# Altium footprint library Inductors SMD.PcbLib: 145 footprints (part 7 of 10)
Each footprint in its own frame and in the unit in brackets; x right, y up, seen from the top. Pads: shape width x height; smd on the part's side, far side on the other; paste and mask are expansions set on the pad; w line width, h text height; cw(c..) or ccw(c..) is an arc to the next point about the centre after c.
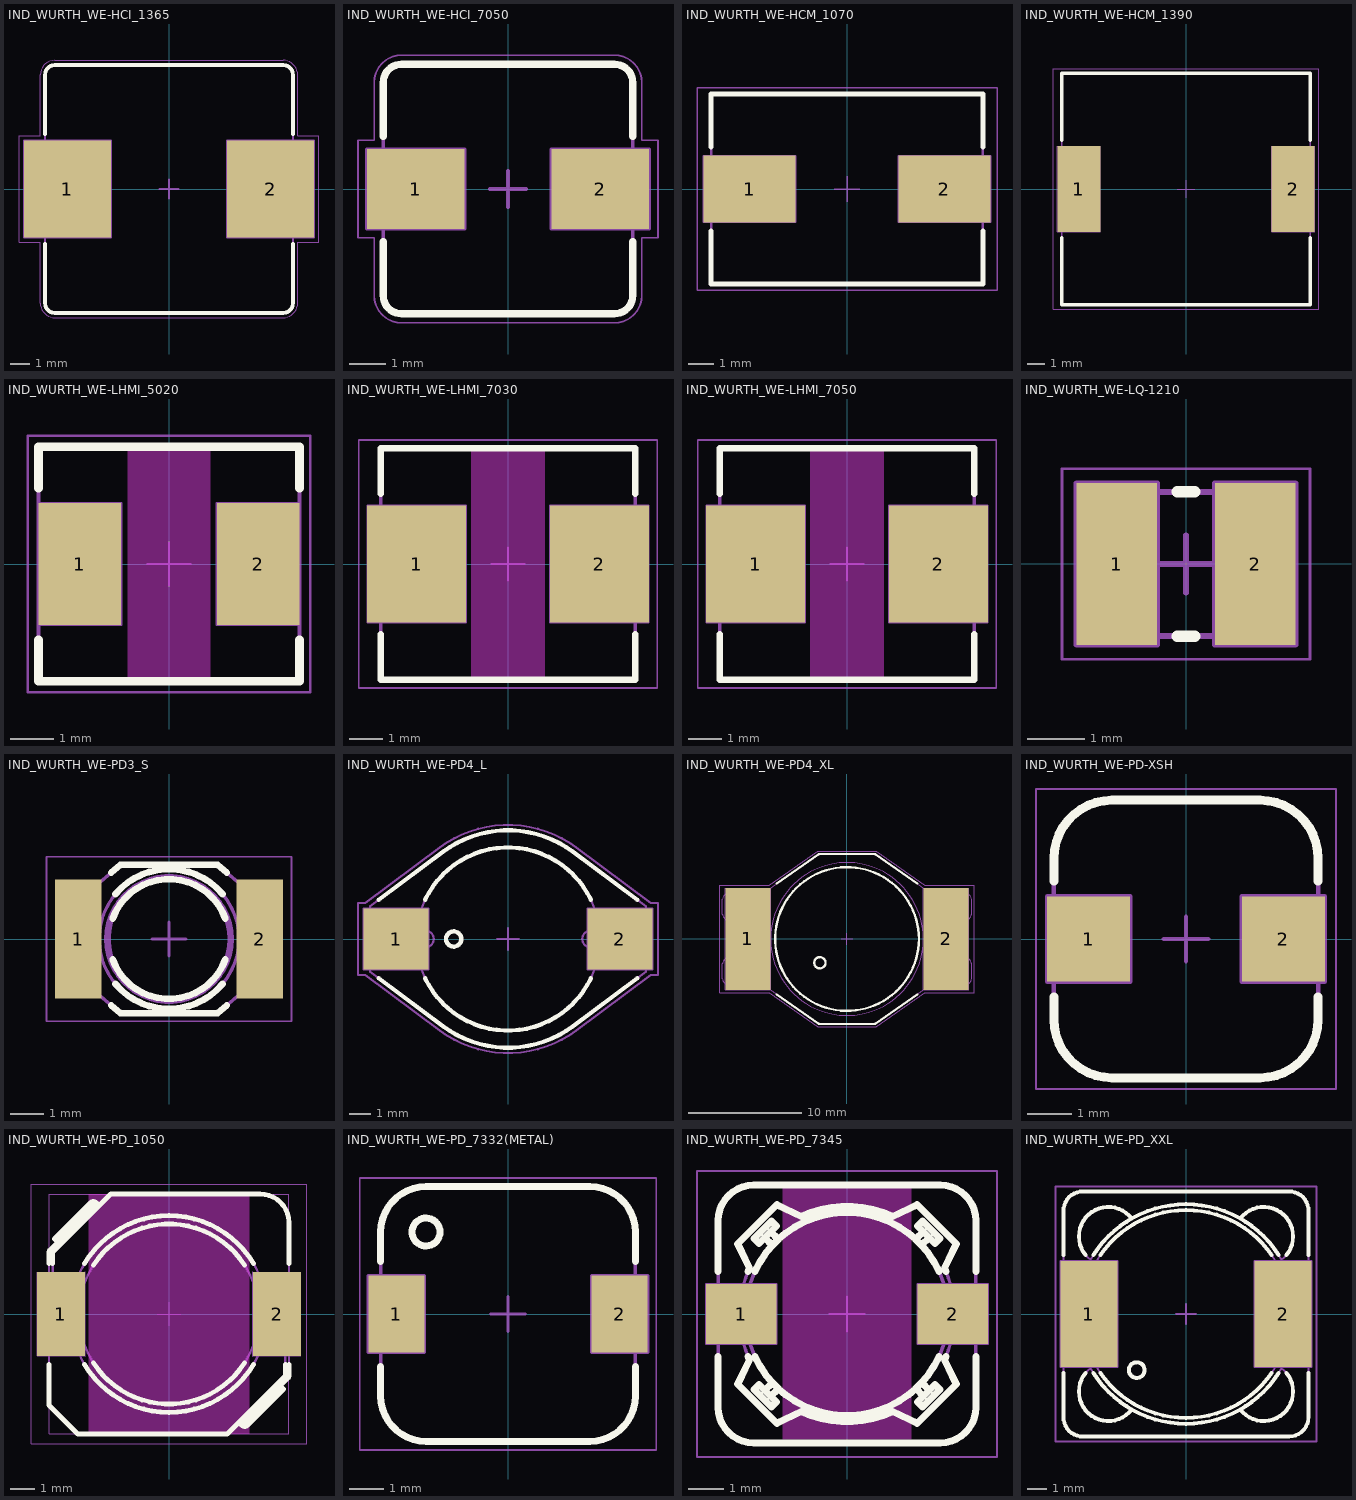
[diagram p6: the footprints below, top view; thin cyan lines are the x and y axes]

## IND_WURTH_WE-HCI_1365 [mm] "SMD Flat Wire High Current Inductor (WE-HCI Series Case 1365), Body 13x13mm"
height 6.5
pads (2):
  rect 4.5x5 smd: 1(-5.25,0) 2(5.25,0)
Top Overlay:
  lines w0.2: -6.4,-2.85 -6.4,-5.9 ccw(c-5.9,-5.9) -5.9,-6.4 5.9,-6.4 ccw(c5.9,-5.9) 6.4,-5.9 6.4,-2.85 ; -6.4,2.85 -6.4,5.9 cw(c-5.9,5.9) -5.9,6.4 5.9,6.4 cw(c5.9,5.9) 6.4,5.9 6.4,2.85
Mechanical 8:
  lines w0.1: -5.75,0 -5.25,0 ; -5.25,-0.5 -5.25,0 ; -5.25,0.5 -5.25,0 ; -4.75,0 -5.25,0 ; -0.5,0 0,0 ; 0,-0.5 0,0 ; 0,0.5 0,0 ; 0.5,0 0,0 ; 4.75,0 5.25,0 ; 5.25,-0.5 5.25,0 ; 5.25,0.5 5.25,0 ; 5.75,0 5.25,0 ; -7.5,-2.5 -7.5,2.5 -3,2.5 -3,-2.5 -7.5,-2.5 ; 3,-2.5 3,2.5 7.5,2.5 7.5,-2.5 3,-2.5
Mechanical 14:
  lines w0.1: -6.4,-1.249 -7.1,-1.249 -7.1,1.249 -6.4,1.249 ; 6.4,-1.249 7.1,-1.249 7.1,1.249 6.4,1.249 ; -6.4,-5.9 ccw(c-5.9,-5.9) -5.9,-6.4 5.9,-6.4 ccw(c5.9,-5.9) 6.4,-5.9 6.4,5.9 ccw(c5.9,5.9) 5.9,6.4 -5.9,6.4 ccw(c-5.9,5.9) -6.4,5.9 -6.4,-5.9
Mechanical 15:
  lines w0.05: -7.75,-2.75 -6.65,-2.75 -6.65,-5.9 ccw(c-5.9,-5.9) -5.9,-6.65 5.9,-6.65 ccw(c5.9,-5.9) 6.65,-5.9 6.65,-2.75 7.75,-2.75 7.75,2.75 6.65,2.75 6.65,5.9 ccw(c5.9,5.9) 5.9,6.65 -5.9,6.65 ccw(c-5.9,5.9) -6.65,5.9 -6.65,2.75 -7.75,2.75 -7.75,-2.75
3D body "IND_WURTH_WE-HCI_1365.stp": height 6.2, standoff 0, extent -7.1,-6.4 7.1,6.4

## IND_WURTH_WE-HCI_7050 [mm] "SMD Flat Wire High Current Inductor (WE-HCI Series), Body 7x6.9mm"
height 5
pads (2):
  rect 2.7x2.2 smd: 1(-2.55,0) 2(2.55,0)
Top Overlay:
  lines w0.2: -3.45,-1.45 -3.45,-2.95 ccw(c-2.95,-2.95) -2.95,-3.45 2.95,-3.45 ccw(c2.95,-2.95) 3.45,-2.95 3.45,-1.45 ; -3.45,1.45 -3.45,2.95 cw(c-2.95,2.95) -2.95,3.45 2.95,3.45 cw(c2.95,2.95) 3.45,2.95 3.45,1.45
Mechanical 8:
  lines w0.1: -3.05,0 -2.55,0 ; -2.55,-0.5 -2.55,0 ; -2.55,0.5 -2.55,0 ; -2.05,0 -2.55,0 ; -0.5,0 0,0 ; 0,-0.5 0,0 ; 0,0.5 0,0 ; 0.5,0 0,0 ; 2.05,0 2.55,0 ; 2.55,-0.5 2.55,0 ; 2.55,0.5 2.55,0 ; 3.05,0 2.55,0 ; -3.9,-1.1 -3.9,1.1 -1.2,1.1 -1.2,-1.1 -3.9,-1.1 ; 1.2,-1.1 1.2,1.1 3.9,1.1 3.9,-1.1 1.2,-1.1
Mechanical 14:
  lines w0.1: -3.45,-0.6 -3.5,-0.6 -3.5,0.6 -3.45,0.6 ; 3.45,-0.6 3.5,-0.6 3.5,0.6 3.45,0.6 ; -3.45,-2.95 ccw(c-2.95,-2.95) -2.95,-3.45 2.95,-3.45 ccw(c2.95,-2.95) 3.45,-2.95 3.45,2.95 ccw(c2.95,2.95) 2.95,3.45 -2.95,3.45 ccw(c-2.95,2.95) -3.45,2.95 -3.45,-2.95
Mechanical 15:
  lines w0.05: -4.15,-1.35 -3.7,-1.35 -3.7,-2.95 ccw(c-2.95,-2.95) -2.95,-3.7 2.95,-3.7 ccw(c2.95,-2.95) 3.7,-2.95 3.7,-1.35 4.15,-1.35 4.15,1.35 3.7,1.35 3.7,2.95 ccw(c2.95,2.95) 2.95,3.7 -2.95,3.7 ccw(c-2.95,2.95) -3.7,2.95 -3.7,1.35 -4.15,1.35 -4.15,-1.35
3D body "IND_WURTH_WE-HCI_7050.stp": height 5, standoff 0, extent -3.5,-3.45 3.5,3.45

## IND_WURTH_WE-HCM_1070 [mm] "SMD High Current Flat Wire Inductor (WE-HCM Series), Body 10.6x7.4mm"
height 7
pads (2):
  rect 3.6x2.6 smd: 1(-3.8,0) 2(3.8,0)
Top Overlay:
  lines w0.2: -5.3,-1.65 -5.3,-3.7 5.3,-3.7 5.3,-1.65 ; -5.3,1.65 -5.3,3.7 5.3,3.7 5.3,1.65
Mechanical 8:
  lines w0.05: -4.3,0 -3.8,0 ; -3.8,-0.5 -3.8,0 ; -3.8,0.5 -3.8,0 ; -3.3,0 -3.8,0 ; -0.5,0 0,0 ; 0,-0.5 0,0 ; 0,0.5 0,0 ; 0.5,0 0,0 ; 3.3,0 3.8,0 ; 3.8,-0.5 3.8,0 ; 3.8,0.5 3.8,0 ; 4.3,0 3.8,0 ; -5.6,-1.3 -2,-1.3 -2,1.3 -5.6,1.3 -5.6,-1.3 ; 2,-1.3 2,1.3 5.6,1.3 5.6,-1.3 2,-1.3
Mechanical 14:
  lines w0.1: -5.3,-3.7 5.3,-3.7 5.3,3.7 -5.3,3.7 -5.3,-3.7
Mechanical 15:
  lines w0.05: -5.85,-3.95 -5.85,3.95 5.85,3.95 5.85,-3.95 -5.85,-3.95
3D body "IND_WURTH_WE-HCM_1070.stp": height 6.8, standoff 0, extent -5.05,-3.5 5.05,3.5

## IND_WURTH_WE-HCM_1390 [mm] "SMD High Current Flat Wire Inductor (WE-HCM Series), Body 14.5x13.5mm"
height 9.5
pads (2):
  rect 2.5x5 smd: 1(-6.25,0) 2(6.25,0)
Top Overlay:
  lines w0.2: -7.25,-2.85 -7.25,-6.75 7.25,-6.75 7.25,-2.85 ; -7.25,2.85 -7.25,6.75 7.25,6.75 7.25,2.85
Mechanical 8:
  lines w0.05: -6.75,0 -6.25,0 ; -6.25,-0.5 -6.25,0 ; -6.25,0.5 -6.25,0 ; -5.75,0 -6.25,0 ; -0.5,0 0,0 ; 0,-0.5 0,0 ; 0,0.5 0,0 ; 0.5,0 0,0 ; 5.75,0 6.25,0 ; 6.25,-0.5 6.25,0 ; 6.25,0.5 6.25,0 ; 6.75,0 6.25,0 ; -7.5,-2.5 -5,-2.5 -5,2.5 -7.5,2.5 -7.5,-2.5 ; 5,-2.5 5,2.5 7.5,2.5 7.5,-2.5 5,-2.5
Mechanical 14:
  lines w0.1: -7.25,-6.75 7.25,-6.75 7.25,6.75 -7.25,6.75 -7.25,-6.75
Mechanical 15:
  lines w0.05: -7.75,-7 -7.75,7 7.75,7 7.75,-7 -7.75,-7
3D body "IND_WURTH_WE-HCM_1390.stp": height 9, standoff 0, extent -7,-6.5 7,6.5

## IND_WURTH_WE-LHMI_5020 [mm] "SMD Power Inductor (We-LHMI Series), Body 6x5.4mm"
height 2
pads (2):
  rect 1.9x2.8 smd: 1(-2.05,0) 2(2.05,0)
Top Layer keep-out:
  region: 0.95,-2.7 0.95,2.7 -0.95,2.7 -0.95,-2.7
Top Overlay:
  lines w0.2: -3,-1.75 -3,-2.7 3,-2.7 3,-1.75 ; -3,1.75 -3,2.7 3,2.7 3,1.75
Mechanical 8:
  lines w0.05: -2.55,0 -2.05,0 ; -2.05,-0.5 -2.05,0 ; -2.05,0.5 -2.05,0 ; -1.55,0 -2.05,0 ; -0.5,0 0,0 ; 0,-0.5 0,0 ; 0,0.5 0,0 ; 0.5,0 0,0 ; 1.55,0 2.05,0 ; 2.05,-0.5 2.05,0 ; 2.05,0.5 2.05,0 ; 2.55,0 2.05,0 ; -3,-1.4 -1.1,-1.4 -1.1,1.4 -3,1.4 -3,-1.4 ; 1.1,-1.4 3,-1.4 3,1.4 1.1,1.4 1.1,-1.4
Mechanical 14:
  lines w0.1: -3,-2.7 3,-2.7 3,2.7 -3,2.7 -3,-2.7
Mechanical 15:
  lines w0.05: -3.25,-2.95 -3.25,2.95 3.25,2.95 3.25,-2.95 -3.25,-2.95
3D body "IND_WURTH_WE-LHMI_5020.stp": height 1.8, standoff 0, extent -2.85,-2.6 2.85,2.6

## IND_WURTH_WE-LHMI_7030 [mm] "SMD Power Inductor (We-LHMI Series), Body 7.6x6.9mm"
height 3
pads (2):
  rect 2.95x3.5 smd: 1(-2.725,0) 2(2.725,0)
Top Layer keep-out:
  region: 1.1,-3.45 1.1,3.45 -1.1,3.45 -1.1,-3.45
Top Overlay:
  lines w0.2: -3.8,-2.1 -3.8,-3.45 3.8,-3.45 3.8,-2.1 ; -3.8,2.1 -3.8,3.45 3.8,3.45 3.8,2.1
Mechanical 8:
  lines w0.05: -3.225,0 -2.725,0 ; -2.725,-0.5 -2.725,0 ; -2.725,0.5 -2.725,0 ; -2.225,0 -2.725,0 ; -0.5,0 0,0 ; 0,-0.5 0,0 ; 0,0.5 0,0 ; 0.5,0 0,0 ; 2.225,0 2.725,0 ; 2.725,-0.5 2.725,0 ; 2.725,0.5 2.725,0 ; 3.225,0 2.725,0 ; -4.2,-1.75 -1.25,-1.75 -1.25,1.75 -4.2,1.75 -4.2,-1.75 ; 1.25,-1.75 1.25,1.75 4.2,1.75 4.2,-1.75 1.25,-1.75
Mechanical 14:
  lines w0.1: -3.8,-3.45 3.8,-3.45 3.8,3.45 -3.8,3.45 -3.8,-3.45
Mechanical 15:
  lines w0.05: -4.45,-3.7 -4.45,3.7 4.45,3.7 4.45,-3.7 -4.45,-3.7
3D body "IND_WURTH_WE-LHMI_7030.stp": height 2.8, standoff 0, extent -3.65,-3.3 3.65,3.3

## IND_WURTH_WE-LHMI_7050 [mm] "SMD Power Inductor (We-LHMI Series), Body 7.6x6.9mm"
height 5
pads (2):
  rect 2.95x3.5 smd: 1(-2.725,0) 2(2.725,0)
Top Layer keep-out:
  region: 1.1,-3.45 1.1,3.45 -1.1,3.45 -1.1,-3.45
Top Overlay:
  lines w0.2: -3.8,-2.1 -3.8,-3.45 3.8,-3.45 3.8,-2.1 ; -3.8,2.1 -3.8,3.45 3.8,3.45 3.8,2.1
Mechanical 8:
  lines w0.05: -3.225,0 -2.725,0 ; -2.725,-0.5 -2.725,0 ; -2.725,0.5 -2.725,0 ; -2.225,0 -2.725,0 ; -0.5,0 0,0 ; 0,-0.5 0,0 ; 0,0.5 0,0 ; 0.5,0 0,0 ; 2.225,0 2.725,0 ; 2.725,-0.5 2.725,0 ; 2.725,0.5 2.725,0 ; 3.225,0 2.725,0 ; -4.2,-1.75 -1.25,-1.75 -1.25,1.75 -4.2,1.75 -4.2,-1.75 ; 1.25,-1.75 1.25,1.75 4.2,1.75 4.2,-1.75 1.25,-1.75
Mechanical 14:
  lines w0.1: -3.8,-3.45 3.8,-3.45 3.8,3.45 -3.8,3.45 -3.8,-3.45
Mechanical 15:
  lines w0.05: -4.45,-3.7 -4.45,3.7 4.45,3.7 4.45,-3.7 -4.45,-3.7
3D body "IND_WURTH_WE-LHMI_7050.stp": height 4.8, standoff 0, extent -3.65,-3.3 3.65,3.3

## IND_WURTH_WE-LQ-1210 [mm] "SMD Inductor, Body 3.2x2.58mm (1210)"
height 2.3
pads (2):
  rect 1.4x2.8 smd: 1(-1.2,0) 2(1.2,0)
Top Overlay:
  lines w0.2: -0.15,-1.25 0.15,-1.25 ; -0.15,1.25 0.15,1.25
Mechanical 8:
  lines w0.1: -1.7,0 -1.2,0 ; -1.2,-0.5 -1.2,0 ; -1.2,0.5 -1.2,0 ; -0.7,0 -1.2,0 ; -0.5,0 0,0 ; 0,-0.5 0,0 ; 0,0.5 0,0 ; 0.5,0 0,0 ; 0.7,0 1.2,0 ; 1.2,-0.5 1.2,0 ; 1.2,0.5 1.2,0 ; 1.7,0 1.2,0 ; -1.9,-1.4 -1.9,1.4 -0.5,1.4 -0.5,-1.4 -1.9,-1.4 ; 0.5,-1.4 0.5,1.4 1.9,1.4 1.9,-1.4 0.5,-1.4
Mechanical 14:
  lines w0.1: -1.2,-1.25 -1.2,1.25 ; 1.2,-1.25 1.2,1.25 ; -1.6,1.25 1.6,1.25 1.6,-1.25 -1.599,-1.25 -1.6,1.25
Mechanical 15:
  lines w0.05: -2.15,-1.65 2.15,-1.65 2.15,1.65 -2.15,1.65 -2.15,-1.65
3D body "IND_WURTH_WE-LQ-1210.stp": height 2, standoff 0, extent -1.6,-1.25 1.6,1.25

## IND_WURTH_WE-PD3_S [mm] "SMD Power Choke, Width 4.45mm Body Lenght 6.6mm Height 2.92mm, WURTH WE-PD3 Serie"
height 2.92
pads (2):
  rect 1.4x3.56 smd: 1(-2.725,0) 2(2.725,0)
Top Overlay:
  lines w0.2: -1.73,-1.993 -1.462,-2.225 1.462,-2.225 1.73,-1.993 ; -1.73,1.993 -1.462,2.225 1.462,2.225 1.73,1.993 ; -1.691,-0.616 ccw(c0,0) 1.691,-0.616 ; -1.691,0.616 cw(c0,0) 1.691,0.616 ; -1.609,-1.35 ccw(c0,0) 1.609,-1.35 ; -1.609,1.35 cw(c0,0) 1.609,1.35
Mechanical 8:
  lines w0.1: -3.23,0 -2.73,0 ; -2.73,-0.5 -2.73,0 ; -2.73,0.5 -2.73,0 ; -2.23,0 -2.73,0 ; -0.5,0 0,0 ; 0,-0.5 0,0 ; 0,0.5 0,0 ; 0.5,0 0,0 ; 2.23,0 2.73,0 ; 2.73,-0.5 2.73,0 ; 2.73,0.5 2.73,0 ; 3.23,0 2.73,0
Mechanical 14:
  circle w0.1: c0,0 r1.8
  circle w0.1: c0,0 r1.9
  circle w0.1: c0,0 r2.1
  lines w0.1: -2.3,-1.5 -1.462,-2.225 1.462,-2.225 2.3,-1.5 ; -2.3,-1.5 -2.3,1.5 ; -2.3,-1.5 -3.3,-0.635 -3.3,0.635 -2.3,1.5 ; -2.3,1.5 -1.462,2.225 1.462,2.225 2.3,1.5 ; 2.3,-1.5 3.3,-0.635 3.3,0.635 2.3,1.5 ; 2.3,-1.5 2.3,1.5
Mechanical 15:
  lines w0.05: -3.68,-2.475 3.68,-2.475 3.68,2.475 -3.68,2.475 -3.68,-2.475
3D body "IND_WURTH_WE-PD3-S.stp": height 2.92, standoff 0, extent -3.3,-2.225 3.3,2.225

## IND_WURTH_WE-PD4_L [mm] "SMD Power Choke, Width 10mm Body Lenght 12.7mm Height 5.3mm, WURTH WE-PD 4 Serie Type L"
height 5.3
pads (2):
  rect 3x2.8 smd: 1(-5.15,0) 2(5.15,0)
Top Overlay:
  circle w0.2: c-2.5,0 r0.35
  lines w0.2: -5.948,-1.8 -2.99,-4.007 ccw(c0,0) 2.99,-4.007 5.948,-1.8 ; -5.948,1.8 -2.99,4.007 cw(c0,0) 2.99,4.007 5.948,1.8 ; -3.811,-1.8 ccw(c0,0) 3.811,-1.8 ; -3.811,1.8 cw(c0,0) 3.811,1.8
Mechanical 8:
  lines w0.1: -5.65,0 -5.15,0 ; -5.15,-0.5 -5.15,0 ; -5.15,0.5 -5.15,0 ; -4.65,0 -5.15,0 ; -0.5,0 0,0 ; 0,-0.5 0,0 ; 0,0.5 0,0 ; 0.5,0 0,0 ; 4.65,0 5.15,0 ; 5.15,-0.5 5.15,0 ; 5.15,0.5 5.15,0 ; 5.65,0 5.15,0 ; -6.65,-1.4 -3.65,-1.4 -3.65,1.4 -6.65,1.4 -6.65,-1.4 ; 3.65,-1.4 6.65,-1.4 6.65,1.4 3.65,1.4 3.65,-1.4
Mechanical 14:
  circle w0.1: c-2.5,0 r0.35
  circle w0.1: c0,0 r4.215
  lines w0.1: -6.2,-1 -6.2,1 ; -4.196,-0.4 -3.815,-0.4 ccw(c-3.815,0) -3.815,0.4 -4.196,0.4 ; -4.095,-1 -6.35,-1 -6.35,-1.5 -2.99,-4.007 ccw(c0,0) 2.99,-4.007 6.35,-1.5 6.35,-1 4.095,-1 ; -4.095,1 -6.35,1 -6.35,1.5 -2.99,4.007 cw(c0,0) 2.99,4.007 6.35,1.5 6.35,1 4.095,1 ; 4.196,-0.4 3.815,-0.4 cw(c3.815,0) 3.815,0.4 4.196,0.4 ; 6.2,-1 6.2,1
Mechanical 15:
  lines w0.1: -6.9,-1.65 -6.567,-1.65 -3.14,-4.208 ccw(c0,0) 3.14,-4.208 6.567,-1.65 6.9,-1.65 6.9,1.65 6.567,1.65 3.14,4.208 ccw(c0,0) -3.14,4.208 -6.567,1.65 -6.9,1.65 -6.9,-1.65
3D body "IND_WURTH_WE-PD4-L.stp": height 5, standoff 0, extent -6.35,-4.991 6.35,4.992

## IND_WURTH_WE-PD4_XL [mm] "SMD Power Choke, Body Width 15mm Body Lenght 15mm Height 7.8mm, WURTH WE-PD 4 Serie Type XL"
height 7.8
pads (2):
  rect 4x9 smd: 1(-8.75,0) 2(8.75,0)
Top Overlay:
  circle w0.2: c0,0 r6.35
  circle w0.2: c-2.395,-2.099 r0.5
  lines w0.2: -6.214,-4.9 -2.552,-7.464 ccw(c-2.437,-7.3) -2.437,-7.5 2.437,-7.5 ccw(c2.437,-7.3) 2.552,-7.464 6.214,-4.9 ; -6.214,4.9 -2.552,7.464 cw(c-2.437,7.3) -2.437,7.5 2.437,7.5 cw(c2.437,7.3) 2.552,7.464 6.214,4.9
Mechanical 8:
  lines w0.1: -9.25,0 -8.75,0 ; -8.75,-0.5 -8.75,0 ; -8.75,0.5 -8.75,0 ; -8.25,0 -8.75,0 ; -0.5,0 0,0 ; 0,-0.5 0,0 ; 0,0.5 0,0 ; 0.5,0 0,0 ; 8.25,0 8.75,0 ; 8.75,-0.5 8.75,0 ; 8.75,0.5 8.75,0 ; 9.25,0 8.75,0 ; -10.75,-4.5 -10.75,4.5 -6.75,4.5 -6.75,-4.5 -10.75,-4.5 ; 6.75,-4.5 6.75,4.5 10.75,4.5 10.75,-4.5 6.75,-4.5
Mechanical 14:
  circle w0.1: c0,0 r6.75
  circle w0.1: c-2.395,-2.099 r0.5
  lines w0.1: -9.8,-3 -10,-3 -10,-3.5 cw(c-10.5,-3.5) -11,-3.5 -11,-2.2 cw(c-10.5,-2.2) -10.852,-1.845 -10.059,-1.059 ccw(c-10.2,-0.917) -10,-0.917 -10,0.917 ccw(c-10.2,0.917) -10.059,1.059 -10.852,1.845 cw(c-10.5,2.2) -11,2.2 -11,3.5 cw(c-10.5,3.5) -10,3.5 -10,3 -9.8,3 ; -7.5,-3.896 ccw(c-7.3,-3.896) -7.415,-4.06 -2.552,-7.464 ccw(c-2.437,-7.3) -2.437,-7.5 2.437,-7.5 ccw(c2.437,-7.3) 2.552,-7.464 7.415,-4.06 ccw(c7.3,-3.896) 7.5,-3.896 ; -7.5,3.896 cw(c-7.3,3.896) -7.415,4.06 -2.552,7.464 cw(c-2.437,7.3) -2.437,7.5 2.437,7.5 cw(c2.437,7.3) 2.552,7.464 7.415,4.06 cw(c7.3,3.896) 7.5,3.896 ; 9.8,-3 10,-3 10,-3.5 ccw(c10.5,-3.5) 11,-3.5 11,-2.2 ccw(c10.5,-2.2) 10.852,-1.845 10.059,-1.059 cw(c10.2,-0.917) 10,-0.917 10,0.917 cw(c10.2,0.917) 10.059,1.059 10.852,1.845 ccw(c10.5,2.2) 11,2.2 11,3.5 ccw(c10.5,3.5) 10,3.5 10,3 9.8,3 ; -9.8,-4 -7.5,-4 -7.5,4 -9.8,4 -9.8,-4 ; 7.5,-4 9.8,-4 9.8,4 7.5,4 7.5,-4
Mechanical 15:
  lines w0.1: -11.25,-4.75 -11.25,4.75 -6.865,4.75 -2.579,7.75 2.579,7.75 6.865,4.75 11.25,4.75 11.25,-4.75 6.865,-4.75 2.579,-7.75 -2.579,-7.75 -6.865,-4.75 -11.25,-4.75
3D body "IND_WURTH_WE-PD4-XL.stp": height 7, standoff 0, extent -11,-7.5 11,7.5

## IND_WURTH_WE-PD-XSH [mm] "Power-Choke Inductor, Body 6.2x5.9mm, WURTH WE-PD Serie Type XSH"
height 5.1
pads (2):
  rect 1.85x1.9 smd: 1(-2.175,0) 2(2.175,0)
Top Overlay:
  lines w0.2: -2.95,-1.3 -2.95,-1.8 ccw(c-1.65,-1.8) -1.65,-3.1 1.65,-3.1 ccw(c1.65,-1.8) 2.95,-1.8 2.95,-1.3 ; -2.95,1.3 -2.95,1.8 cw(c-1.65,1.8) -1.65,3.1 1.65,3.1 cw(c1.65,1.8) 2.95,1.8 2.95,1.3
Mechanical 8:
  lines w0.1: -2.675,0 -2.175,0 ; -2.175,-0.5 -2.175,0 ; -2.175,0.5 -2.175,0 ; -1.675,0 -2.175,0 ; -0.5,0 0,0 ; 0,-0.5 0,0 ; 0,0.5 0,0 ; 0.5,0 0,0 ; 1.675,0 2.175,0 ; 2.175,-0.5 2.175,0 ; 2.175,0.5 2.175,0 ; 2.675,0 2.175,0 ; -3.1,-0.95 -1.25,-0.95 -1.25,0.95 -3.1,0.95 -3.1,-0.95 ; 1.25,-0.95 3.1,-0.95 3.1,0.95 1.25,0.95 1.25,-0.95
Mechanical 14:
  lines w0.1: -2.95,-1.8 ccw(c-1.65,-1.8) -1.65,-3.1 1.65,-3.1 ccw(c1.65,-1.8) 2.95,-1.8 2.95,1.8 ccw(c1.65,1.8) 1.65,3.1 -1.65,3.1 ccw(c-1.65,1.8) -2.95,1.8 -2.95,-1.8
Mechanical 15:
  lines w0.05: -3.35,-3.35 3.35,-3.35 3.35,3.35 -3.35,3.35 -3.35,-3.35
3D body "IND_WURTH_WE-PD-XSH.stp": height 5.1, standoff 0, extent -2.95,-3.1 2.95,3.1

## IND_WURTH_WE-PD_1050 [mm] "Power-Choke Inductor, Body 10x10mm, WURTH WE-PD Serie Type 1050"
height 10
pads (2):
  rect 2x3.5 smd: 1(-4.5,0) 2(4.5,0)
Top Layer keep-out:
  region: 3.35,-5 3.35,5 -3.35,5 -3.35,-5
Top Overlay:
  lines w0.2: -5,-2.1 -5,-3.8 -3.8,-5 2.424,-5 4.85,-2.575 4.85,-2.1 ; -5,2.1 -5,2.566 cw(c-4.83,2.566) -4.95,2.687 -3.137,4.5 ccw(c-3.151,4.514) -3.165,4.529 -4.671,3.022 -4.777,3.128 -3.271,4.635 cw(c-3.151,4.514) -3.031,4.394 ; -4.85,2.1 -4.85,2.575 -2.425,5 3.8,5 cw(c3.8,3.8) 5,3.8 5,2.1 ; -3.522,-2.1 ccw(c0,0) 3.521,-2.1 ; -3.522,2.1 cw(c0,0) 3.521,2.1 ; -3.15,-2.035 ccw(c0,0) 3.15,-2.035 ; -3.15,2.035 cw(c0,0) 3.15,2.035 ; 3.03,-4.394 ccw(c3.15,-4.514) 3.271,-4.635 4.777,-3.128 4.671,-3.022 3.165,-4.529 cw(c3.15,-4.514) 3.136,-4.5 4.95,-2.687 ccw(c4.83,-2.566) 5,-2.566 5,-2.1
Mechanical 8:
  lines w0.05: -5,0 -4.5,0 ; -4.5,-0.5 -4.5,0 ; -4.5,0.5 -4.5,0 ; -4,0 -4.5,0 ; -0.5,0 0,0 ; 0,-0.5 0,0 ; 0,0.5 0,0 ; 0.5,0 0,0 ; 4,0 4.5,0 ; 4.5,-0.5 4.5,0 ; 4.5,0.5 4.5,0 ; 5,0 4.5,0 ; -5.5,-1.75 -5.5,1.75 -3.5,1.75 -3.5,-1.75 -5.5,-1.75 ; -5,-5 5,-5 5,5 -5,5 -5,-5 ; 3.5,-1.75 5.5,-1.75 5.5,1.75 3.5,1.75 3.5,-1.75
Mechanical 14:
  circle w0.1: c0,0 r3.75
  lines w0.1: -5,1.5 -4,1.5 -4,0.98 -3.75,0.98 -3.75,0.5 -4,0.5 ccw(c-4,0) -4,-0.5 -3.75,-0.5 -3.75,-0.98 -4,-0.98 -4,-1.5 -5,-1.5 -5,2.566 cw(c-4.83,2.566) -4.95,2.687 -3.137,4.5 ccw(c-3.151,4.514) -3.165,4.529 -4.671,3.022 -4.777,3.128 -3.271,4.635 cw(c-3.151,4.514) -3.031,4.394 ; -4.85,-1.6 -4.85,-1.5 ; -4.85,1.5 -4.85,2.575 -2.425,5 3.8,5 cw(c3.8,3.8) 5,3.8 5,1.6 3.775,1.6 ; -4.85,1.6 -3.775,1.6 ; -4.07,-0.495 cw(c0,0) -4.07,0.495 ; -3.988,0.951 cw(c0,0) 3.981,0.98 ; -3.981,-0.98 ccw(c0,0) 3.99,-0.944 ; -3.775,-1.6 -5,-1.6 -5,-3.8 -3.8,-5 2.424,-5 4.85,-2.575 4.85,-1.5 ; 3.03,-4.394 ccw(c3.15,-4.514) 3.271,-4.635 4.777,-3.128 4.671,-3.022 3.165,-4.529 cw(c3.15,-4.514) 3.136,-4.5 4.95,-2.687 ccw(c4.83,-2.566) 5,-2.566 5,1.5 4,1.5 4,0.98 3.75,0.98 3.75,0.5 4,0.5 cw(c4,0) 4,-0.5 3.75,-0.5 3.75,-0.98 4,-0.98 4,-1.5 5,-1.5 ; 3.775,-1.6 4.85,-1.6 ; 4.07,-0.495 ccw(c0,0) 4.07,0.495 ; 4.85,1.5 4.85,1.6
Mechanical 15:
  lines w0.05: -5.75,-5.4 -5.75,5.4 5.75,5.4 5.75,-5.4 -5.75,-5.4
3D body "IND_WURTH_WE-PD_1050.stp": height 4.8, standoff 0, extent -5,-5 5,5

## IND_WURTH_WE-PD_7332(METAL) [mm] "Power Choke, WE-PD Serie, Body 7.3x7.3mm (Metal Base)"
height 3.4
pads (2):
  rect 1.6x2.2 smd: 1(-3.2,0) 2(3.2,0)
Top Overlay:
  circle w0.2: c-2.35,2.35 r0.4
  lines w0.2: -3.65,-1.5 -3.65,-2.35 ccw(c-2.35,-2.35) -2.35,-3.65 2.35,-3.65 ccw(c2.35,-2.35) 3.65,-2.35 3.65,-1.5 ; -3.65,1.5 -3.65,2.35 cw(c-2.35,2.35) -2.35,3.65 2.35,3.65 cw(c2.35,2.35) 3.65,2.35 3.65,1.5
Mechanical 8:
  lines w0.1: -3.7,0 -3.2,0 ; -3.2,-0.5 -3.2,0 ; -3.2,0.5 -3.2,0 ; -2.7,0 -3.2,0 ; -0.5,0 0,0 ; 0,-0.5 0,0 ; 0,0.5 0,0 ; 0.5,0 0,0 ; 2.7,0 3.2,0 ; 3.2,-0.5 3.2,0 ; 3.2,0.5 3.2,0 ; 3.7,0 3.2,0 ; -2.4,-1.1 -2.4,1.1 ; -2.4,-1.1 -2.4,1.1 ; -2.4,-1.1 -4,-1.1 -4,1.1 -2.4,1.1 ; 4,-1.1 4,1.1 ; 4,-1.1 4,1.1 ; 4,-1.1 2.4,-1.1 2.4,1.1 4,1.1
Mechanical 14:
  circle w0.1: c-2.35,2.35 r0.4
  lines w0.1: -3.65,-2.35 ccw(c-2.35,-2.35) -2.35,-3.65 2.35,-3.65 ccw(c2.35,-2.35) 3.65,-2.35 3.65,2.35 ccw(c2.35,2.35) 2.35,3.65 -2.35,3.65 ccw(c-2.35,2.35) -3.65,2.35 -3.65,-2.35
Mechanical 15:
  lines w0.05: -4.25,-3.9 4.25,-3.9 4.25,3.9 -4.25,3.9 -4.25,-3.9
3D body "IND_WURTH_WE-PD_7332(METAL).stp": height 3.4, standoff 0, extent -3.65,-3.65 3.65,3.65

## IND_WURTH_WE-PD_7345 [mm] "Power-Choke Inductor, Body 7.3x7.3mm, WURTH WE-PD Serie Type 7345"
height 10
pads (2):
  rect 2x1.7 smd: 1(-3,0) 2(3,0)
Top Layer keep-out:
  region: 1.825,-3.55 1.825,3.625 -1.825,3.625 -1.825,-3.55
Top Overlay:
  lines w0.2: -3.65,-1.2 -3.65,-2.65 ccw(c-2.65,-2.65) -2.65,-3.65 2.65,-3.65 ccw(c2.65,-2.65) 3.65,-2.65 3.65,-1.2 ; -3.65,1.2 -3.65,2.65 cw(c-2.65,2.65) -2.65,3.65 2.65,3.65 cw(c2.65,2.65) 3.65,2.65 3.65,1.2 ; -2.804,-1.2 ccw(c0,0) -2.763,-1.293 -3.1,-1.988 -1.989,-3.099 -1.293,-2.763 ccw(c0,0) 1.292,-2.763 1.988,-3.099 3.099,-1.988 2.762,-1.293 ccw(c0,0) 2.804,-1.2 ; -2.804,1.2 cw(c0,0) -2.763,1.293 -3.1,1.988 -1.989,3.099 -1.293,2.763 cw(c0,0) 1.292,2.763 1.988,3.099 3.099,1.988 2.762,1.293 cw(c0,0) 2.804,1.2 ; -2.613,-1.2 ccw(c0,0) 2.612,-1.2 ; -2.613,1.2 cw(c0,0) 2.612,1.2 ; -2.335,-2.165 -2.114,-1.948 ; -2.335,2.165 -2.116,1.946 ; -2.165,-2.335 -1.943,-2.12 ; -2.165,2.335 -1.946,2.116 ; 1.946,2.116 2.165,2.335 ; 1.955,-2.108 2.165,-2.335 ; 2.108,1.955 2.335,2.165 ; 2.12,-1.942 2.335,-2.165 ; -2.639,-2.144 -2.144,-2.639 -2.003,-2.497 -2.498,-2.003 -2.639,-2.144 ; -2.639,2.144 -2.144,2.639 -2.003,2.497 -2.498,2.003 -2.639,2.144 ; 2.002,-2.497 2.497,-2.003 2.639,-2.144 2.144,-2.639 2.002,-2.497 ; 2.002,2.497 2.144,2.639 2.639,2.144 2.497,2.003 2.002,2.497
Mechanical 8:
  lines w0.05: -3.5,0 -3,0 ; -3,-0.5 -3,0 ; -3,0.5 -3,0 ; -2.5,0 -3,0 ; -0.5,0 0,0 ; 0,-0.5 0,0 ; 0,0.5 0,0 ; 0.5,0 0,0 ; 2.5,0 3,0 ; 3,-0.5 3,0 ; 3,0.5 3,0 ; 3.5,0 3,0 ; -4,-0.85 -4,0.85 -2,0.85 -2,-0.85 -4,-0.85 ; 2,-0.85 2,0.85 4,0.85 4,-0.85 2,-0.85
Mechanical 14:
  circle w0.1: c0,0 r2.875
  lines w0.1: -2.335,-2.165 -2.114,-1.948 ; -2.335,2.165 -2.116,1.946 ; -2.165,-2.335 -1.943,-2.12 ; -2.165,2.335 -1.946,2.116 ; 1.946,2.116 2.165,2.335 ; 1.955,-2.108 2.165,-2.335 ; 2.108,1.955 2.335,2.165 ; 2.12,-1.942 2.335,-2.165 ; -3.65,-2.65 ccw(c-2.65,-2.65) -2.65,-3.65 2.65,-3.65 ccw(c2.65,-2.65) 3.65,-2.65 3.65,2.65 ccw(c2.65,2.65) 2.65,3.65 -2.65,3.65 ccw(c-2.65,2.65) -3.65,2.65 -3.65,-2.65 ; -3.1,-1.988 -2.763,-1.293 cw(c0,0) -2.763,1.293 -3.1,1.988 -1.989,3.099 -1.293,2.763 cw(c0,0) 1.292,2.763 1.988,3.099 3.099,1.988 2.762,1.293 cw(c0,0) 2.762,-1.293 3.099,-1.988 1.988,-3.099 1.292,-2.763 cw(c0,0) -1.293,-2.763 -1.989,-3.099 -3.1,-1.988 ; -2.639,-2.144 -2.144,-2.639 -2.003,-2.497 -2.498,-2.003 -2.639,-2.144 ; -2.639,2.144 -2.144,2.639 -2.003,2.497 -2.498,2.003 -2.639,2.144 ; 2.002,-2.497 2.497,-2.003 2.639,-2.144 2.144,-2.639 2.002,-2.497 ; 2.002,2.497 2.144,2.639 2.639,2.144 2.497,2.003 2.002,2.497
Mechanical 15:
  lines w0.05: -4.25,-4.05 4.25,-4.05 4.25,4.05 -4.25,4.05 -4.25,-4.05
3D body "IND_WURTH_WE-PD_7345.stp": height 4.1, standoff 0, extent -3.65,-3.65 3.65,3.65

## IND_WURTH_WE-PD_XXL [mm] "Power-Choke Inductor, Body 12x12mm, WURTH WE-PD Serie Type XXL"
height 10
pads (2):
  rect 2.9x5.4 smd: 1(-4.95,0) 2(4.95,0)
Top Overlay:
  circle w0.2: c-2.51,-2.86 r0.4
  lines w0.2: -6.25,-3 -6.25,-5.25 ccw(c-5.25,-5.25) -5.25,-6.25 5.25,-6.25 ccw(c5.25,-5.25) 6.25,-5.25 6.25,-3 ; -6.25,3 -6.25,5.25 cw(c-5.25,5.25) -5.25,6.25 5.25,6.25 cw(c5.25,5.25) 6.25,5.25 6.25,3 ; -5.113,-3 ccw(c-3.96,-3.96) -2.767,-4.869 ; -5.113,3 cw(c-3.96,3.96) -2.767,4.869 ; -4.729,-3 ccw(c0,0) 4.729,-3 ; -4.729,3 cw(c0,0) 4.729,3 ; -4.369,-3 ccw(c0,0) 4.369,-3 ; -4.369,3 cw(c0,0) 4.369,3 ; 2.767,-4.869 ccw(c3.96,-3.96) 5.113,-3 ; 2.767,4.869 cw(c3.96,3.96) 5.113,3
Mechanical 8:
  lines w0.1: -5.45,0 -4.95,0 ; -4.95,-0.5 -4.95,0 ; -4.95,0.5 -4.95,0 ; -4.45,0 -4.95,0 ; -0.5,0 0,0 ; 0,-0.5 0,0 ; 0,0.5 0,0 ; 0.5,0 0,0 ; 4.45,0 4.95,0 ; 4.95,-0.5 4.95,0 ; 4.95,0.5 4.95,0 ; 5.45,0 4.95,0 ; -3.5,-2.7 -3.5,2.7 ; -3.5,-2.7 -3.5,2.7 ; -3.5,-2.7 -6.4,-2.7 -6.4,2.7 -3.5,2.7 ; 3.5,-2.7 3.5,2.7 ; 3.5,-2.7 6.4,-2.7 6.4,2.7 3.5,2.7 ; 3.5,-2.7 3.5,2.7
Mechanical 14:
  circle w0.1: c-2.51,-2.86 r0.4
  circle w0.1: c0,0 r5.3
  circle w0.1: c0,0 r5.6
  lines w0.1: -4.869,-2.767 ccw(c-3.96,-3.96) -2.767,-4.869 ; -4.869,2.767 cw(c-3.96,3.96) -2.767,4.869 ; 2.767,-4.869 ccw(c3.96,-3.96) 4.869,-2.767 ; 2.767,4.869 cw(c3.96,3.96) 4.869,2.767 ; -6.25,-5.25 ccw(c-5.25,-5.25) -5.25,-6.25 5.25,-6.25 ccw(c5.25,-5.25) 6.25,-5.25 6.25,5.25 ccw(c5.25,5.25) 5.25,6.25 -5.25,6.25 ccw(c-5.25,5.25) -6.25,5.25 -6.25,-5.25
Mechanical 15:
  lines w0.1: -6.65,-6.5 -6.65,6.5 6.65,6.5 6.65,-6.5 -6.65,-6.5
3D body "IND_WURTH_WE-PD-XXL.stp": height 10, standoff 0, extent -6.25,-6.25 6.25,6.25